# Altium integrated library mylib.IntLib: 236 symbols (part 1 of 2) (continued)
## NMOS
designator Q?
20V P-Channel Enhancement Mode MOSFET; DatasheetVersion: Jul-99; PackageReference: SOT23; PackageDescription: SOT-23; 3 Leads; Body 3.1 x 2.5 mm, inc. leads (LxW max), Alternate Lead Configuration; ComponentLink1Description: Manufacturer Link; ComponentLink1URL: http://www.zetex.com/; ComponentLink2Description: Datasheet; ComponentLink2URL: www.zetex.com/3.0/pdf/ZXM61P02F.pdf
footprint LC-SOT-23-3
pins: 1 G, 2 S, 3 D

## NMOS-1
designator Q?, comment NMOS
20V P-Channel Enhancement Mode MOSFET; DatasheetVersion: Jul-99; PackageReference: SOT23; PackageDescription: SOT-23; 3 Leads; Body 3.1 x 2.5 mm, inc. leads (LxW max), Alternate Lead Configuration; ComponentLink1Description: Manufacturer Link; ComponentLink1URL: http://www.zetex.com/; ComponentLink2Description: Datasheet; ComponentLink2URL: www.zetex.com/3.0/pdf/ZXM61P02F.pdf
footprint LC-SOT-23-3
pins: 1 G, 2 S, 3 D

## NPN
designator Q?, comment 8050
footprint SOT-23
pins: 1, 2, 3

## OPA453
designator U?
Wide-Bandwidth JFET Input Operational Amplifier
footprint TO-220_7
pins: 1 IN+ (in), 2 IN- (in), 3 NC, 4 V- (power), 5 V+ (power), 6 OUT (out), 7 Flag

## P87C54X2BDH
designator U?
footprint TSSOP-38
pins: 1 P30/RXD, 2 P31/TXD, 3 P33/~{INT}1, 4 P34/T0, 5 P36/~{WR}, 6 P37/~{RD}, 7 X2, 8 X1, 9 VSS, 10 P20/A8, 11 P21/A9, 12 P22/A10, 13 P23/A11, 14 P24/A12, 15 P25/A13, 16 P26/A14, 17 P27/A15, 18 ~{PSEN}, 19 ALE/~{PROG}, 20 ~{EA}/Vpp, 21 P07/AD7, 22 P06/AD6, 23 P05/AD5, 24 P04/AD4, 25 P03/AD3, 26 P02/AD2, 27 P01/AD1, 28 P00/AD0, 29 VDD, 30 P10/T2, 31 P11/T2EX, 32 P12, 33 P13, 34 P14, 35 P15, 36 P16, 37 P17, 38 RST

## P89LPC906
designator U?
footprint SO-8
pins: 1 RST/P1.5, 2 VSS, 3 P0.6/CMP1/KBI6, 4 XTAL1/P3.1, 5 CLKOUT/XTAL2/P3.0, 6 VDD, 7 P0.5/CMPREF/KBI5, 8 P0.4/CIN1A/KBI4

## P89LPC932
designator U?
footprint TSSOP-28
footprint PLCC-28
pins: 1 P20 (io), 2 P21 (io), 3 P00 (io), 4 P17 (io), 5 P16 (io), 6 P15/~{RST} (out), 7 VSS (io), 8 P31 (io), 9 P30 (io), 10 P14 (io), 11 P13 (io), 12 P12 (io), 13 P22 (io), 14 P23 (io), 15 P24 (io), 16 P25 (io), 17 P11 (io), 18 P10 (io), 19 P07 (io), 20 P06 (io), 21 VDD (power), 22 P05 (io), 23 P04 (io), 24 P03 (io), 25 P02 (io), 26 P01 (io), 27 P26 (io), 28 P27 (io)

## PCB_VIA
designator V?, comment via  (value not drawn)
footprint PCB_Via
pins: 1

## PCF8563
designator U?
footprint SO-8
pins: 1 Osci, 2 Osco, 3 /INT, 4 VSS, 5 SDA, 6 SCL, 7 Clko, 8 VDD

## PDIUSBD12
designator U?
footprint TSSOP-28
pins: 1 DATA0, 2 DATA1, 3 DATA2, 4 DATA3, 5 GND, 6 DATA4, 7 DATA5, 8 DATA6, 9 DATA7, 10 ALE, 11 CS_N, 12 SUSPEND, 13 CLKOUT, 14 INT_N, 15 RD_N, 16 WR_N, 17 DMREQ, 18 DMACK_N, 19 EOT_N, 20 RESET_N, 21 GL_N, 22 XTAL1, 23 XTAL2, 24 VCC, 25 D-, 26 D+, 27 VOUT3.3V, 28 A0

## PRTR5V0U2X
designator U?
footprint SOT-143B
pins: 1 GND, 2 I/O1, 3 I/O2, 4 VCC

## R5F100FE
designator U?
Supplier 1: Digi-Key; Supplier Part Number 1: R5F100FE
footprint QFP10X10-G44/P.8N
pins: 1 P4.1/TI07 (io), 2 P4.0/TOOL0 (io), 3 ~{RESET} (in), 4 P12.4/XT2 (in), 5 P12.3/XT1 (io), 6 P137/INTP0, 7 P12.2/X2 (io), 8 P12.1/X1 (io), 9 REGC (in), 10 Vss (power), 11 Vdd (io), 12 P6.0/SCL0 (io), 13 P6.1/SDA0 (io), 14 P6.2 (io), 15 P6.3 (io), 16 P3.1/TI03/PCLBUZ0 (io), 17 P7.3/KR3 (io), 18 P7.2/KR2 (io), 19 P7.1/KR1/SDA21 (io), 20 P7.0/KR0/SCL21 (io), 21 P3.0/SCL11/INTP3 (io), 22 P5.0/SDA11/INTP1 (io), 23 INTP2/P5.1 (io), 24 TI02/P1.7 (io), 25 TI01/P1.6 (io), 26 PCLBUZ1/P1.5 (out), 27 RXD2/P1.4 (out), 28 TXD2/P1.3 (io), 29 SO00/TXD0/P1.2 (out), 30 SI00/RXD0/P1.1 (io), 31 SCK00/SCL00/P1.0 (io), 32 P146 (power), 33 ANI18/P147 (power), 34 P2.7/AN17 (io), 35 P2.6/AN16 (io), 36 P2.5/AN15 (io), 37 P2.4/AN14 (io), 38 P2.3/AN13 (io), 39 P2.2 /AN12 (io), 40 P2.1/AN11 (io), 41 P2.0/AN10 (io), 42 P0.1/RxD1 (io), 43 P0.0/TxD1 (io), 44 P12.0/ANI19 (io)

## R5F100GE
designator U?  Supplier Part Number 1: R5F100FE
Supplier 1: Digi-Key
footprint QFP10X10-G44/P.8N
pins: 1 P4.1/TI07 (io), 2 P4.0/TOOL0 (io), 3 ~{RESET} (in), 4 P12.4/XT2 (in), 5 P12.3/XT1 (io), 6 P137/INTP0, 7 P12.2/X2 (io), 8 P12.1/X1 (io), 9 REGC (in), 10 Vss (power), 11 Vdd (io), 12 P6.0/SCL0 (io), 13 P6.1/SDA0 (io), 14 P6.2 (io), 15 P6.3 (io), 16 P3.1/TI03/PCLBUZ0 (io), 17 P7.3/KR3 (io), 18 P7.2/KR2 (io), 19 P7.1/KR1/SDA21 (io), 20 P7.0/KR0/SCL21 (io), 21 P3.0/SCL11/INTP3 (io), 22 P5.0/SDA11/INTP1 (io), 23 INTP2/P5.1 (io), 24 TI02/P1.7 (io), 25 TI01/P1.6 (io), 26 PCLBUZ1/P1.5 (out), 27 RXD2/P1.4 (out), 28 TXD2/P1.3 (io), 29 SO00/TXD0/P1.2 (out), 30 SI00/RXD0/P1.1 (io), 31 SCK00/SCL00/P1.0 (io), 32 P146 (power), 33 ANI18/P147 (power), 34 P2.7/AN17 (io), 35 P2.6/AN16 (io), 36 P2.5/AN15 (io), 37 P2.4/AN14 (io), 38 P2.3/AN13 (io), 39 P2.2 /AN12 (io), 40 P2.1/AN11 (io), 41 P2.0/AN10 (io), 42 P0.1/RxD1 (io), 43 P0.0/TxD1 (io), 44 P12.0/ANI19 (io)

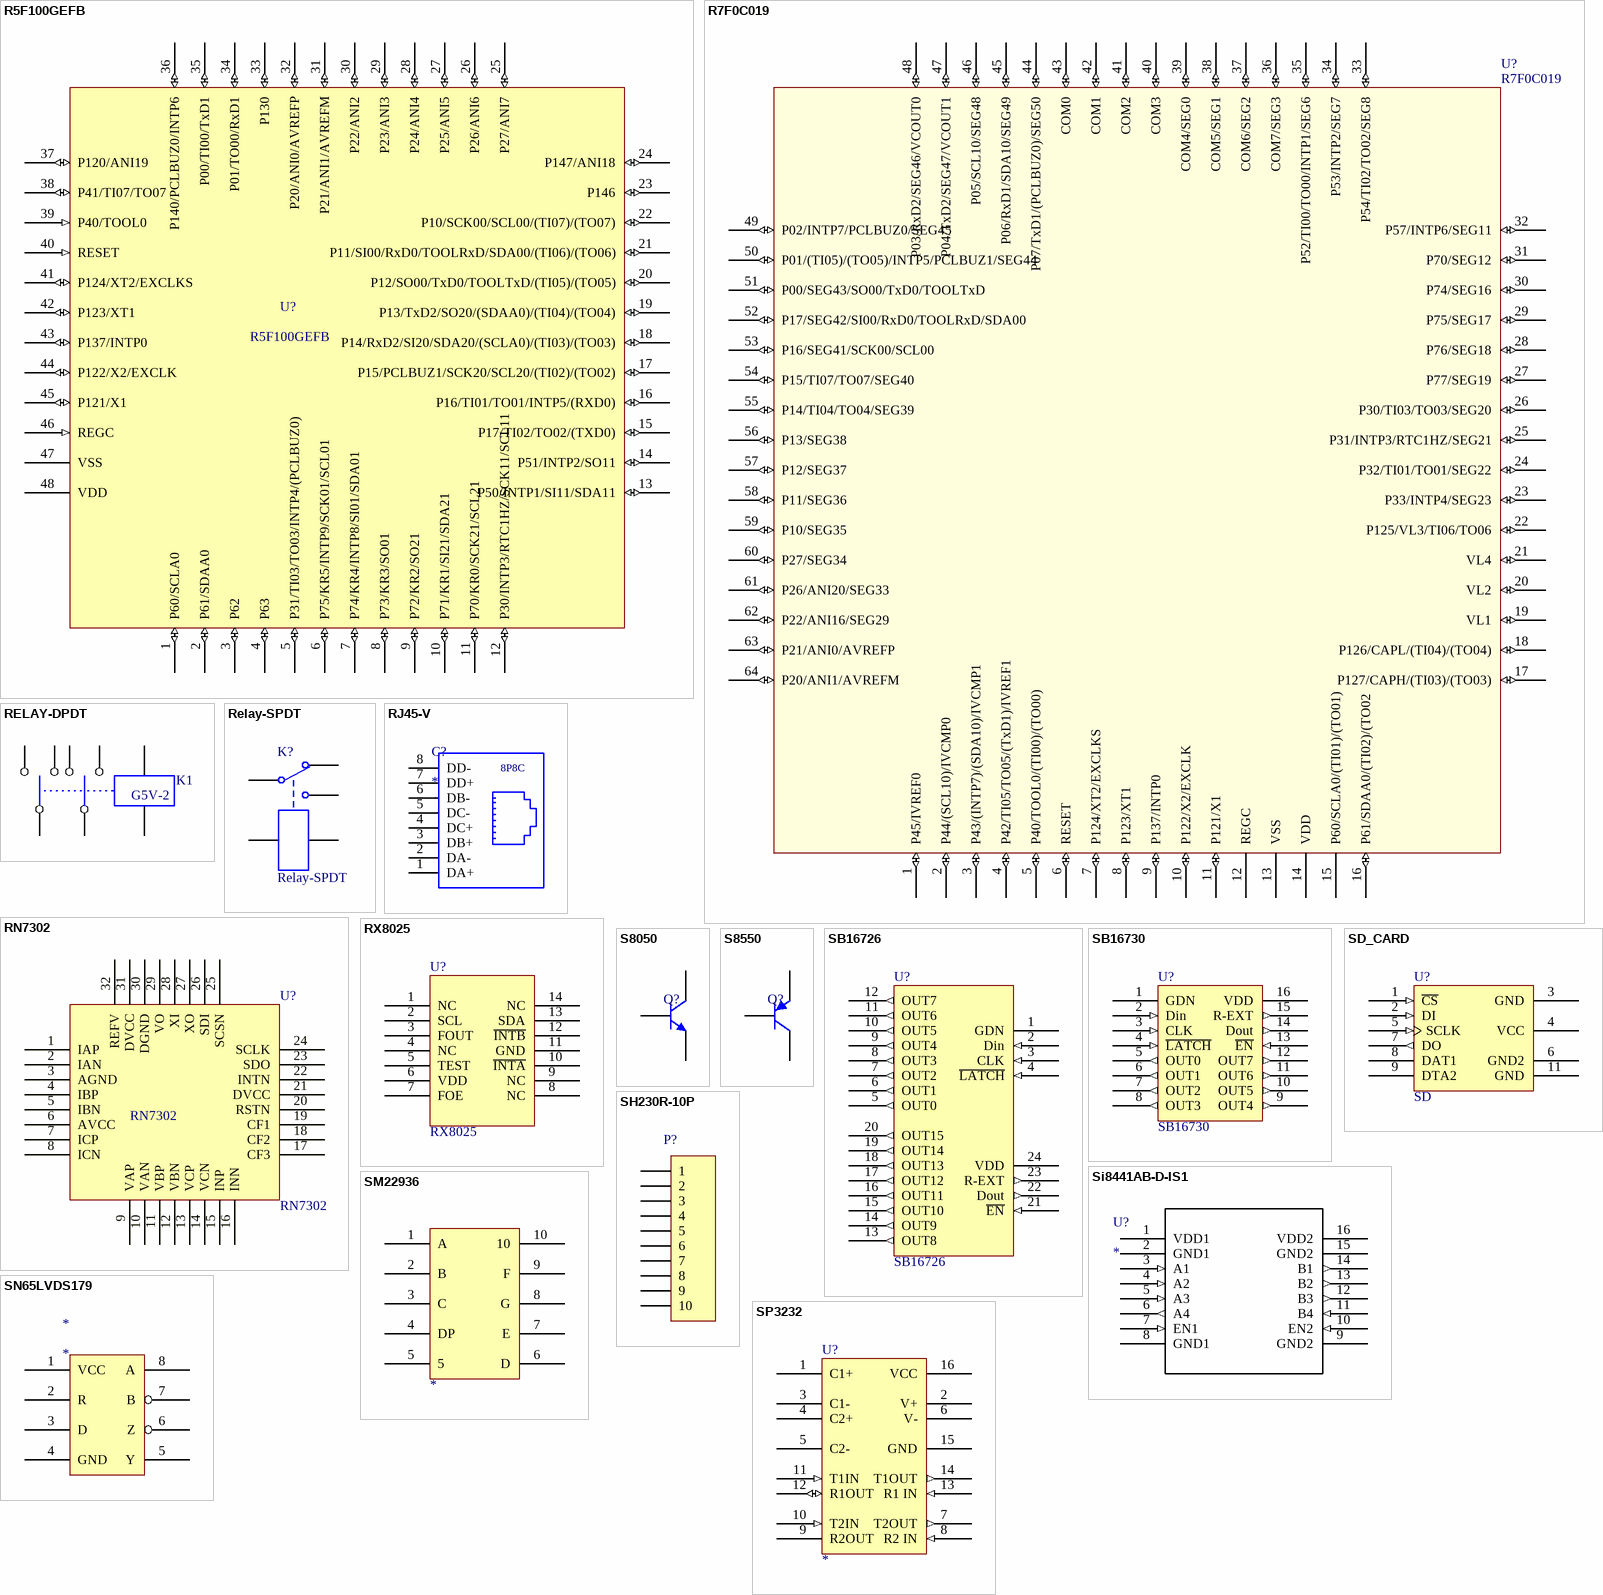
[diagram p6: symbols R5F100GEFB to SP3232]

## R5F100GEFB
designator U?
footprint LQFP48
pins: 1 P60/SCLA0 (io), 2 P61/SDAA0 (io), 3 P62 (io), 4 P63 (io), 5 P31/TI03/TO03/INTP4/(PCLBUZ0) (io), 6 P75/KR5/INTP9/SCK01/SCL01 (io), 7 P74/KR4/INTP8/SI01/SDA01 (io), 8 P73/KR3/SO01 (io), 9 P72/KR2/SO21 (io), 10 P71/KR1/SI21/SDA21 (io), 11 P70/KR0/SCK21/SCL21 (io), 12 P30/INTP3/RTC1HZ/SCK11/SCL11 (io), 13 P50/INTP1/SI11/SDA11 (io), 14 P51/INTP2/SO11 (io), 15 P17/TI02/TO02/(TXD0) (io), 16 P16/TI01/TO01/INTP5/(RXD0) (io), 17 P15/PCLBUZ1/SCK20/SCL20/(TI02)/(TO02) (io), 18 P14/RxD2/SI20/SDA20/(SCLA0)/(TI03)/(TO03) (io), 19 P13/TxD2/SO20/(SDAA0)/(TI04)/(TO04) (io), 20 P12/SO00/TxD0/TOOLTxD/(TI05)/(TO05) (io), 21 P11/SI00/RxD0/TOOLRxD/SDA00/(TI06)/(TO06) (io), 22 P10/SCK00/SCL00/(TI07)/(TO07) (io), 23 P146 (io), 24 P147/ANI18 (io), 25 P27/ANI7 (io), 26 P26/ANI6 (io), 27 P25/ANI5 (io), 28 P24/ANI4 (io), 29 P23/ANI3 (io), 30 P22/ANI2 (io), 31 P21/ANI1/AVREFM (io), 32 P20/ANI0/AVREFP (io), 33 P130 (io), 34 P01/TO00/RxD1 (io), 35 P00/TI00/TxD1 (io), 36 P140/PCLBUZ0/INTP6 (io), 37 P120/ANI19 (io), 38 P41/TI07/TO07 (io), 39 P40/TOOL0 (in), 40 RESET (in), 41 P124/XT2/EXCLKS (io), 42 P123/XT1 (io), 43 P137/INTP0 (io), 44 P122/X2/EXCLK (io), 45 P121/X1 (io), 46 REGC (in), 47 VSS (power), 48 VDD (power)

## R7F0C019
designator U?
footprint LC-LQFP-64_10x10x05P
pins: 1 P45/IVREF0 (io), 2 P44/(SCL10)/IVCMP0 (io), 3 P43/(INTP7)/(SDA10)/IVCMP1 (io), 4 P42/TI05/TO05/(TxD1)/IVREF1 (io), 5 P40/TOOL0/(TI00)/(TO00) (io), 6 RESET (io), 7 P124/XT2/EXCLKS (io), 8 P123/XT1 (io), 9 P137/INTP0 (io), 10 P122/X2/EXCLK (io), 11 P121/X1 (io), 12 REGC (power), 13 VSS (power), 14 VDD (power), 15 P60/SCLA0/(TI01)/(TO01) (power), 16 P61/SDAA0/(TI02)/(TO02 (io), 17 P127/CAPH/(TI03)/(TO03) (io), 18 P126/CAPL/(TI04)/(TO04) (io), 19 VL1 (io), 20 VL2 (io), 21 VL4 (io), 22 P125/VL3/TI06/TO06 (io), 23 P33/INTP4/SEG23 (io), 24 P32/TI01/TO01/SEG22 (io), 25 P31/INTP3/RTC1HZ/SEG21 (io), 26 P30/TI03/TO03/SEG20 (io), 27 P77/SEG19 (io), 28 P76/SEG18 (io), 29 P75/SEG17 (io), 30 P74/SEG16 (io), 31 P70/SEG12 (io), 32 P57/INTP6/SEG11 (io), 33 P54/TI02/TO02/SEG8 (io), 34 P53/INTP2/SEG7 (io), 35 P52/TI00/TO00/INTP1/SEG6 (io), 36 COM7/SEG3 (io), 37 COM6/SEG2 (io), 38 COM5/SEG1 (io), 39 COM4/SEG0 (io), 40 COM3 (io), 41 COM2 (io), 42 COM1 (io), 43 COM0 (io), 44 P07/TxD1/(PCLBUZ0)/SEG50 (io), 45 P06/RxD1/SDA10/SEG49 (io), 46 P05/SCL10/SEG48 (io), 47 P04/TxD2/SEG47/VCOUT1 (io), 48 P03/RxD2/SEG46/VCOUT0 (io), 49 P02/INTP7/PCLBUZ0/SEG45 (io), 50 P01/(TI05)/(TO05)/INTP5/PCLBUZ1/SEG44 (io), 51 P00/SEG43/SO00/TxD0/TOOLTxD (io), 52 P17/SEG42/SI00/RxD0/TOOLRxD/SDA00 (io), 53 P16/SEG41/SCK00/SCL00 (io), 54 P15/TI07/TO07/SEG40 (io), 55 P14/TI04/TO04/SEG39 (io), 56 P13/SEG38 (io), 57 P12/SEG37 (io), 58 P11/SEG36 (io), 59 P10/SEG35 (io), 60 P27/SEG34 (io), 61 P26/ANI20/SEG33 (io), 62 P22/ANI16/SEG29 (io), 63 P21/ANI0/AVREFP (io), 64 P20/ANI1/AVREFM (io)

## RELAY-DPDT
designator K1, comment G5V-2
footprint G5V-2
pins: 1, 2, 3, 4, 5, 6, 7, 8

## Relay-SPDT
designator K?
Single-Pole Dual-Throw Relay; Published: 24-Mar-1999; LatestRevisionDate: 17-Jul-2002; LatestRevisionNote: Re-released for DXP Platform.; PackageReference: MODULE5B; Publisher: Altium Limited
footprint JDQ_HF32FA
pins: 1, 2, 3, 4, 5

## RJ45-V
designator C?
WR-COM Modular Jack RJ45 Vertical; Manufacturer: Würth Elektronik eiSos GmbH; partNo: 615008138021; ComponentLink1 Description: Manufacturer; ComponentLink2 Description: Datasheet; NoPins: 8; ComponentLink1URL: http://www.we-online.de; ComponentLink2URL: http://katalog.we-online.de/em/datasheet/615008138021.pdf; Created by: Karrer Zheng; Created Date: 10/27/2014
footprint RJ45-V (RJ45 Vertical)
pins: 1 DA+, 2 DA-, 3 DB+, 4 DC+, 5 DC-, 6 DB-, 7 DD+, 8 DD-
text: 8P8C

## RN7302
designator U?
footprint LQFP32
footprint RN-LQFP32
pins: 1 IAP, 2 IAN, 3 AGND, 4 IBP, 5 IBN, 6 AVCC, 7 ICP, 8 ICN, 9 VAP, 10 VAN, 11 VBP, 12 VBN, 13 VCP, 14 VCN, 15 INP, 16 INN, 17 CF3, 18 CF2, 19 CF1, 20 RSTN, 21 DVCC, 22 INTN, 23 SDO, 24 SCLK, 25 SCSN, 26 SDI, 27 XO, 28 XI, 29 VO, 30 DGND, 31 DVCC, 32 REFV
2 alternate drawings of the same symbol

## RX8025
designator U?
U?
footprint RX8025 (Footprint not found)
pins: 1 NC, 2 SCL, 3 FOUT, 4 NC, 5 TEST, 6 VDD, 7 FOE, 8 NC, 9 NC, 10 ~{INTA}, 11 GND, 12 ~{INTB}, 13 SDA, 14 NC

## S8050
designator Q?  (value not drawn)
footprint LC-SOT-23-3
pins: 1, 2, 3

## S8550
designator Q?  (value not drawn)
footprint LC-SOT-23-3
pins: 1, 2, 3

## SB16726
designator U?
footprint SSOP24 (Footprint not found)
pins: 1 GDN (power), 2 Din (in), 3 CLK (in), 4 ~{LATCH} (in), 5 OUT0 (out), 6 OUT1 (out), 7 OUT2 (out), 8 OUT3 (out), 9 OUT4 (out), 10 OUT5 (out), 11 OUT6 (out), 12 OUT7 (out), 13 OUT8 (out), 14 OUT9 (out), 15 OUT10 (out), 16 OUT11 (out), 17 OUT12 (out), 18 OUT13 (out), 19 OUT14 (out), 20 OUT15 (out), 21 ~{EN} (in), 22 Dout (out), 23 R-EXT (out), 24 VDD (power)

## SB16730
designator U?
footprint Model Name (Footprint not found)
footprint SSOP20 (Footprint not found)
pins: 1 GDN (power), 2 Din (in), 3 CLK (in), 4 ~{LATCH} (in), 5 OUT0 (out), 6 OUT1 (out), 7 OUT2 (out), 8 OUT3 (out), 9 OUT4 (out), 10 OUT5 (out), 11 OUT6 (out), 12 OUT7 (out), 13 ~{EN} (in), 14 Dout (out), 15 R-EXT (out), 16 VDD (power)

## SD_CARD
designator U?, comment SD
footprint SD_CARD2
pins: 1 ~{CS} (in), 2 DI (in), 3 GND (power), 4 VCC (power), 5 SCLK (in), 6 GND2 (power), 7 DO (out), 8 DAT1, 9 DTA2, 11 GND (power)

## SH230R-10P
designator P?, comment SH230R-5.08  (value not drawn)
footprint SH230V-10P-5.08
pins: 1, 2, 3, 4, 5, 6, 7, 8, 9, 10

## Si8441AB-D-IS1
designator U?
Imported; RefDes: RefDes; Type: DEV; Value: Value
footprint SOIC-16
pins: 1 VDD1, 2 GND1, 3 A1 (in), 4 A2 (in), 5 A3 (in), 6 A4 (out), 7 EN1 (in), 8 GND1, 9 GND2, 10 EN2 (in), 11 B4 (in), 12 B3 (out), 13 B2 (out), 14 B1 (out), 15 GND2, 16 VDD2

## SM22936
designator ?
pins: 1 A, 2 B, 3 C, 4 DP, 5, 6 D, 7 E, 8 G, 9 F, 10

## SN65LVDS179
designator *
pins: 1 VCC (power), 2 R, 3 D, 4 GND (power), 5 Y, 6 Z, 7 B, 8 A

## SP3232
designator U?
+-15KV ESD-PROTECTED, +5V RS-232 TRANSCEIVERS
footprint SO-16
pins: 1 C1+, 2 V+ (power), 3 C1-, 4 C2+, 5 C2-, 6 V- (power), 7 T2OUT (out), 8 R2 IN (in), 9 R2OUT, 10 T2IN (in), 11 T1IN (in), 12 R1OUT (io), 13 R1 IN (in), 14 T1OUT (out), 15 GND (power), 16 VCC (power)

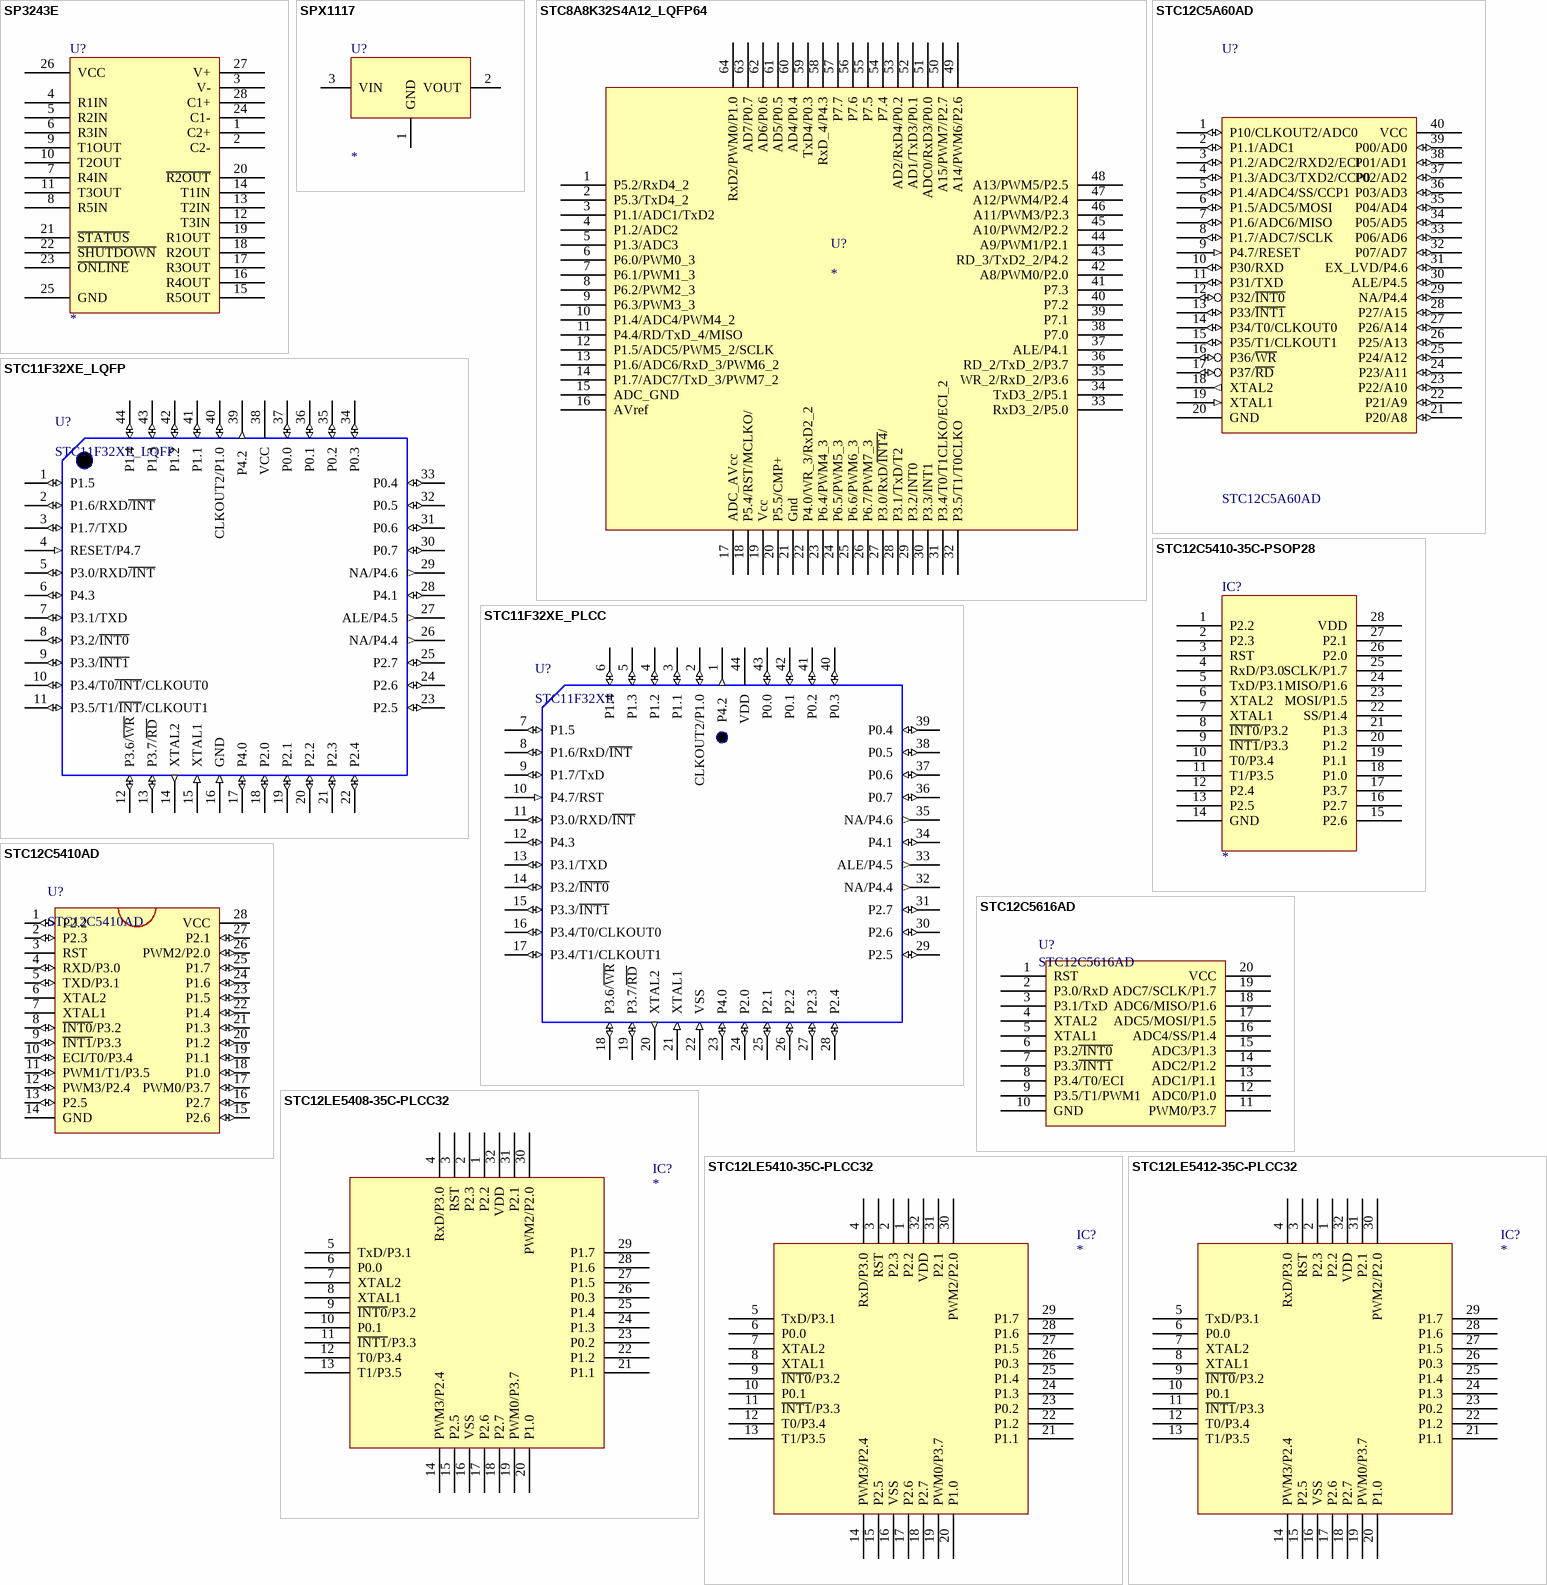
[diagram p7: symbols SP3243E to STC12LE5412-35C-PLCC32]

## SP3243E
designator U?
footprint SSOP-28
pins: 1 C2+, 2 C2-, 3 V-, 4 R1IN, 5 R2IN, 6 R3IN, 7 R4IN, 8 R5IN, 9 T1OUT, 10 T2OUT, 11 T3OUT, 12 T3IN, 13 T2IN, 14 T1IN, 15 R5OUT, 16 R4OUT, 17 R3OUT, 18 R2OUT, 19 R1OUT, 20 ~{R2OUT}, 21 ~{STATUS}, 22 ~{SHUTDOWN}, 23 ~{ONLINE}, 24 C1-, 25 GND, 26 VCC, 27 V+, 28 C1+

## SPX1117
designator U?
footprint SOT-223
pins: 1 GND, 2 VOUT, 3 VIN

## STC8A8K32S4A12_LQFP64
designator U?
footprint LQFP64S
pins: 1 P5.2/RxD4_2, 2 P5.3/TxD4_2, 3 P1.1/ADC1/TxD2, 4 P1.2/ADC2 , 5 P1.3/ADC3, 6 P6.0/PWM0_3, 7 P6.1/PWM1_3, 8 P6.2/PWM2_3, 9 P6.3/PWM3_3, 10 P1.4/ADC4/PWM4_2, 11 P4.4/RD/TxD_4/MISO, 12 P1.5/ADC5/PWM5_2/SCLK, 13 P1.6/ADC6/RxD_3/PWM6_2, 14 P1.7/ADC7/TxD_3/PWM7_2, 15 ADC_GND (power), 16 AVref (power), 17 ADC_AVcc, 18 P5.4/RST/MCLKO/ , 19 Vcc, 20 P5.5/CMP+, 21 Gnd, 22 P4.0/WR_3/RxD2_2, 23 P6.4/PWM4_3, 24 P6.5/PWM5_3, 25 P6.6/PWM6_3, 26 P6.7/PWM7_3, 27 P3.0/RxD/~{INT4}/ , 28 P3.1/TxD/T2, 29 P3.2/INT0, 30 P3.3/INT1, 31 P3.4/T0/T1CLKO/ECI_2, 32 P3.5/T1/T0CLKO, 33 RxD3_2/P5.0, 34 TxD3_2/P5.1, 35 WR_2/RxD_2/P3.6, 36 RD_2/TxD_2/P3.7, 37 ALE/P4.1, 38 P7.0, 39 P7.1, 40 P7.2, 41 P7.3, 42 A8/PWM0/P2.0, 43 RD_3/TxD2_2/P4.2, 44 A9/PWM1/P2.1, 45 A10/PWM2/P2.2, 46 A11/PWM3/P2.3, 47 A12/PWM4/P2.4, 48 A13/PWM5/P2.5, 49 A14/PWM6/P2.6, 50 A15/PWM7/P2.7, 51 ADC0/RxD3/P0.0, 52 AD1/TxD3/P0.1, 53 AD2/RxD4/P0.2, 54 P7.4, 55 P7.5, 56 P7.6, 57 P7.7, 58 RxD_4/P4.3, 59 TxD4/P0.3, 60 AD4/P0.4, 61 AD5/P0.5, 62 AD6/P0.6, 63 AD7/P0.7, 64 RxD2/PWM0/P1.0

## STC11F32XE_LQFP
designator U?
footprint QFP44
pins: 1 P1.5 (io), 2 P1.6/RXD~{/INT} (io), 3 P1.7/TXD (io), 4 RESET/P4.7 (in), 5 P3.0/RXD~{/INT} (io), 6 P4.3 (io), 7 P3.1/TXD (io), 8 P3.2/~{INT0} (io), 9 P3.3/~{INT1} (io), 10 P3.4/T0~{/INT}/CLKOUT0 (io), 11 P3.5/T1/~{INT}/CLKOUT1 (io), 12 P3.6/~{WR} (io), 13 P3.7/~{RD} (io), 14 XTAL2 (out), 15 XTAL1 (in), 16 GND (in), 17 P4.0 (io), 18 P2.0  (io), 19 P2.1  (io), 20 P2.2 (io), 21 P2.3  (io), 22 P2.4  (io), 23 P2.5 (io), 24 P2.6 (io), 25 P2.7 (io), 26 NA/P4.4 (out), 27 ALE/P4.5 (out), 28 P4.1 (io), 29 NA/P4.6 (out), 30 P0.7 (io), 31 P0.6 (io), 32 P0.5 (io), 33 P0.4 (io), 34 P0.3 (io), 35 P0.2 (io), 36 P0.1 (io), 37 P0.0 (io), 38 VCC (power), 39 P4.2  (out), 40 CLKOUT2/P1.0 (io), 41 P1.1 (io), 42 P1.2 (io), 43 P1.3 (io), 44 P1.4 (io)

## STC11F32XE_PLCC
designator U?, comment STC11F32XE
pins: 1 P4.2  (out), 2 CLKOUT2/P1.0 (io), 3 P1.1 (io), 4 P1.2 (io), 5 P1.3 (io), 6 P1.4 (io), 7 P1.5 (io), 8 P1.6/RxD/~{INT} (io), 9 P1.7/TxD (io), 10 P4.7/RST (in), 11 P3.0/RXD/~{INT} (io), 12 P4.3  (io), 13 P3.1/TXD (io), 14 P3.2/~{INT0} (io), 15 P3.3/~{INT1} (io), 16 P3.4/T0/CLKOUT0 (io), 17 P3.4/T1/CLKOUT1 (io), 18 P3.6/~{WR} (io), 19 P3.7/~{RD} (io), 20 XTAL2 (out), 21 XTAL1 (in), 22 VSS (in), 23 P4.0 (io), 24 P2.0  (io), 25 P2.1  (io), 26 P2.2  (io), 27 P2.3  (io), 28 P2.4  (io), 29 P2.5 (io), 30 P2.6 (io), 31 P2.7 (io), 32 NA/P4.4 (out), 33 ALE/P4.5 (out), 34 P4.1 (io), 35 NA/P4.6 (out), 36 P0.7 (io), 37 P0.6 (io), 38 P0.5 (io), 39 P0.4 (io), 40 P0.3 (io), 41 P0.2 (io), 42 P0.1 (io), 43 P0.0 (io), 44 VDD (power)

## STC12C5A60AD
designator U?
footprint DIP40
pins: 1 P10/CLKOUT2/ADC0 (io), 2 P1.1/ADC1 (io), 3 P1.2/ADC2/RXD2/ECI (io), 4 P1.3/ADC3/TXD2/CCP0 (io), 5 P1.4/ADC4/SS/CCP1 (io), 6 P1.5/ADC5/MOSI (io), 7 P1.6/ADC6/MISO (io), 8 P1.7/ADC7/SCLK (io), 9 P4.7/RESET (in), 10 P30/RXD (io), 11 P31/TXD (io), 12 P32/~{INT0} (io), 13 P33/~{INT1} (io), 14 P34/T0/CLKOUT0 (io), 15 P35/T1/CLKOUT1 (io), 16 P36/~{WR} (io), 17 P37/~{RD} (io), 18 XTAL2 (out), 19 XTAL1 (in), 20 GND (power), 21 P20/A8 (io), 22 P21/A9 (io), 23 P22/A10 (io), 24 P23/A11 (io), 25 P24/A12 (io), 26 P25/A13 (io), 27 P26/A14 (io), 28 P27/A15 (io), 29 NA/P4.4 (io), 30 ALE/P4.5 (io), 31 EX_LVD/P4.6 (io), 32 P07/AD7 (io), 33 P06/AD6 (io), 34 P05/AD5 (io), 35 P04/AD4 (io), 36 P03/AD3 (io), 37 P02/AD2 (io), 38 P01/AD1 (io), 39 P00/AD0 (io), 40 VCC (power)

## STC12C5410-35C-PSOP28
designator IC?
footprint SOP-28
footprint DIP-28
pins: 1 P2.2, 2 P2.3, 3 RST, 4 RxD/P3.0, 5 TxD/P3.1, 6 XTAL2, 7 XTAL1, 8 ~{INT0}/P3.2, 9 ~{INT1}/P3.3, 10 T0/P3.4, 11 T1/P3.5, 12 P2.4, 13 P2.5, 14 GND, 15 P2.6, 16 P2.7, 17 P3.7, 18 P1.0, 19 P1.1, 20 P1.2, 21 P1.3, 22 SS/P1.4, 23 MOSI/P1.5, 24 MISO/P1.6, 25 SCLK/P1.7, 26 P2.0, 27 P2.1, 28 VDD

## STC12C5410AD
designator U?
pins: 1 P2.2 (io), 2 P2.3 (io), 3 RST, 4 RXD/P3.0 (io), 5 TXD/P3.1 (io), 6 XTAL2, 7 XTAL1, 8 ~{INT0}/P3.2 (io), 9 ~{INT1}/P3.3 (io), 10 ECI/T0/P3.4 (io), 11 PWM1/T1/P3.5 (io), 12 PWM3/P2.4 (io), 13 P2.5 (io), 14 GND (power), 15 P2.6 (io), 16 P2.7 (io), 17 PWM0/P3.7 (io), 18 P1.0 (io), 19 P1.1 (io), 20 P1.2 (io), 21 P1.3 (io), 22 P1.4 (io), 23 P1.5 (io), 24 P1.6 (io), 25 P1.7 (io), 26 PWM2/P2.0 (io), 27 P2.1 (io), 28 VCC (power)

## STC12C5616AD
designator U?
footprint STC-SOP20
pins: 1 RST, 2 P3.0/RxD, 3 P3.1/TxD, 4 XTAL2, 5 XTAL1, 6 P3.2~{/INT0}, 7 P3.3~{/INT1}, 8 P3.4/T0/ECI, 9 P3.5/T1/PWM1, 10 GND, 11 PWM0/P3.7, 12 ADC0/P1.0, 13 ADC1/P1.1, 14 ADC2/P1.2, 15 ADC3/P1.3, 16 ADC4/SS/P1.4, 17 ADC5/MOSI/P1.5, 18 ADC6/MISO/P1.6, 19 ADC7/SCLK/P1.7, 20 VCC

## STC12LE5408-35C-PLCC32
designator IC?
footprint TQFP32
pins: 1 P2.2, 2 P2.3, 3 RST, 4 RxD/P3.0, 5 TxD/P3.1, 6 P0.0, 7 XTAL2, 8 XTAL1, 9 ~{INT0}/P3.2, 10 P0.1, 11 ~{INT1}/P3.3, 12 T0/P3.4, 13 T1/P3.5, 14 PWM3/P2.4, 15 P2.5, 16 VSS, 17 P2.6, 18 P2.7, 19 PWM0/P3.7, 20 P1.0, 21 P1.1, 22 P1.2, 23 P0.2, 24 P1.3, 25 P1.4, 26 P0.3, 27 P1.5, 28 P1.6, 29 P1.7, 30 PWM2/P2.0, 31 P2.1, 32 VDD

## STC12LE5410-35C-PLCC32
designator IC?
footprint TQFP32
pins: 1 P2.2, 2 P2.3, 3 RST, 4 RxD/P3.0, 5 TxD/P3.1, 6 P0.0, 7 XTAL2, 8 XTAL1, 9 ~{INT0}/P3.2, 10 P0.1, 11 ~{INT1}/P3.3, 12 T0/P3.4, 13 T1/P3.5, 14 PWM3/P2.4, 15 P2.5, 16 VSS, 17 P2.6, 18 P2.7, 19 PWM0/P3.7, 20 P1.0, 21 P1.1, 22 P1.2, 23 P0.2, 24 P1.3, 25 P1.4, 26 P0.3, 27 P1.5, 28 P1.6, 29 P1.7, 30 PWM2/P2.0, 31 P2.1, 32 VDD

## STC12LE5412-35C-PLCC32
designator IC?
footprint TQFP32
pins: 1 P2.2, 2 P2.3, 3 RST, 4 RxD/P3.0, 5 TxD/P3.1, 6 P0.0, 7 XTAL2, 8 XTAL1, 9 ~{INT0}/P3.2, 10 P0.1, 11 ~{INT1}/P3.3, 12 T0/P3.4, 13 T1/P3.5, 14 PWM3/P2.4, 15 P2.5, 16 VSS, 17 P2.6, 18 P2.7, 19 PWM0/P3.7, 20 P1.0, 21 P1.1, 22 P1.2, 23 P0.2, 24 P1.3, 25 P1.4, 26 P0.3, 27 P1.5, 28 P1.6, 29 P1.7, 30 PWM2/P2.0, 31 P2.1, 32 VDD

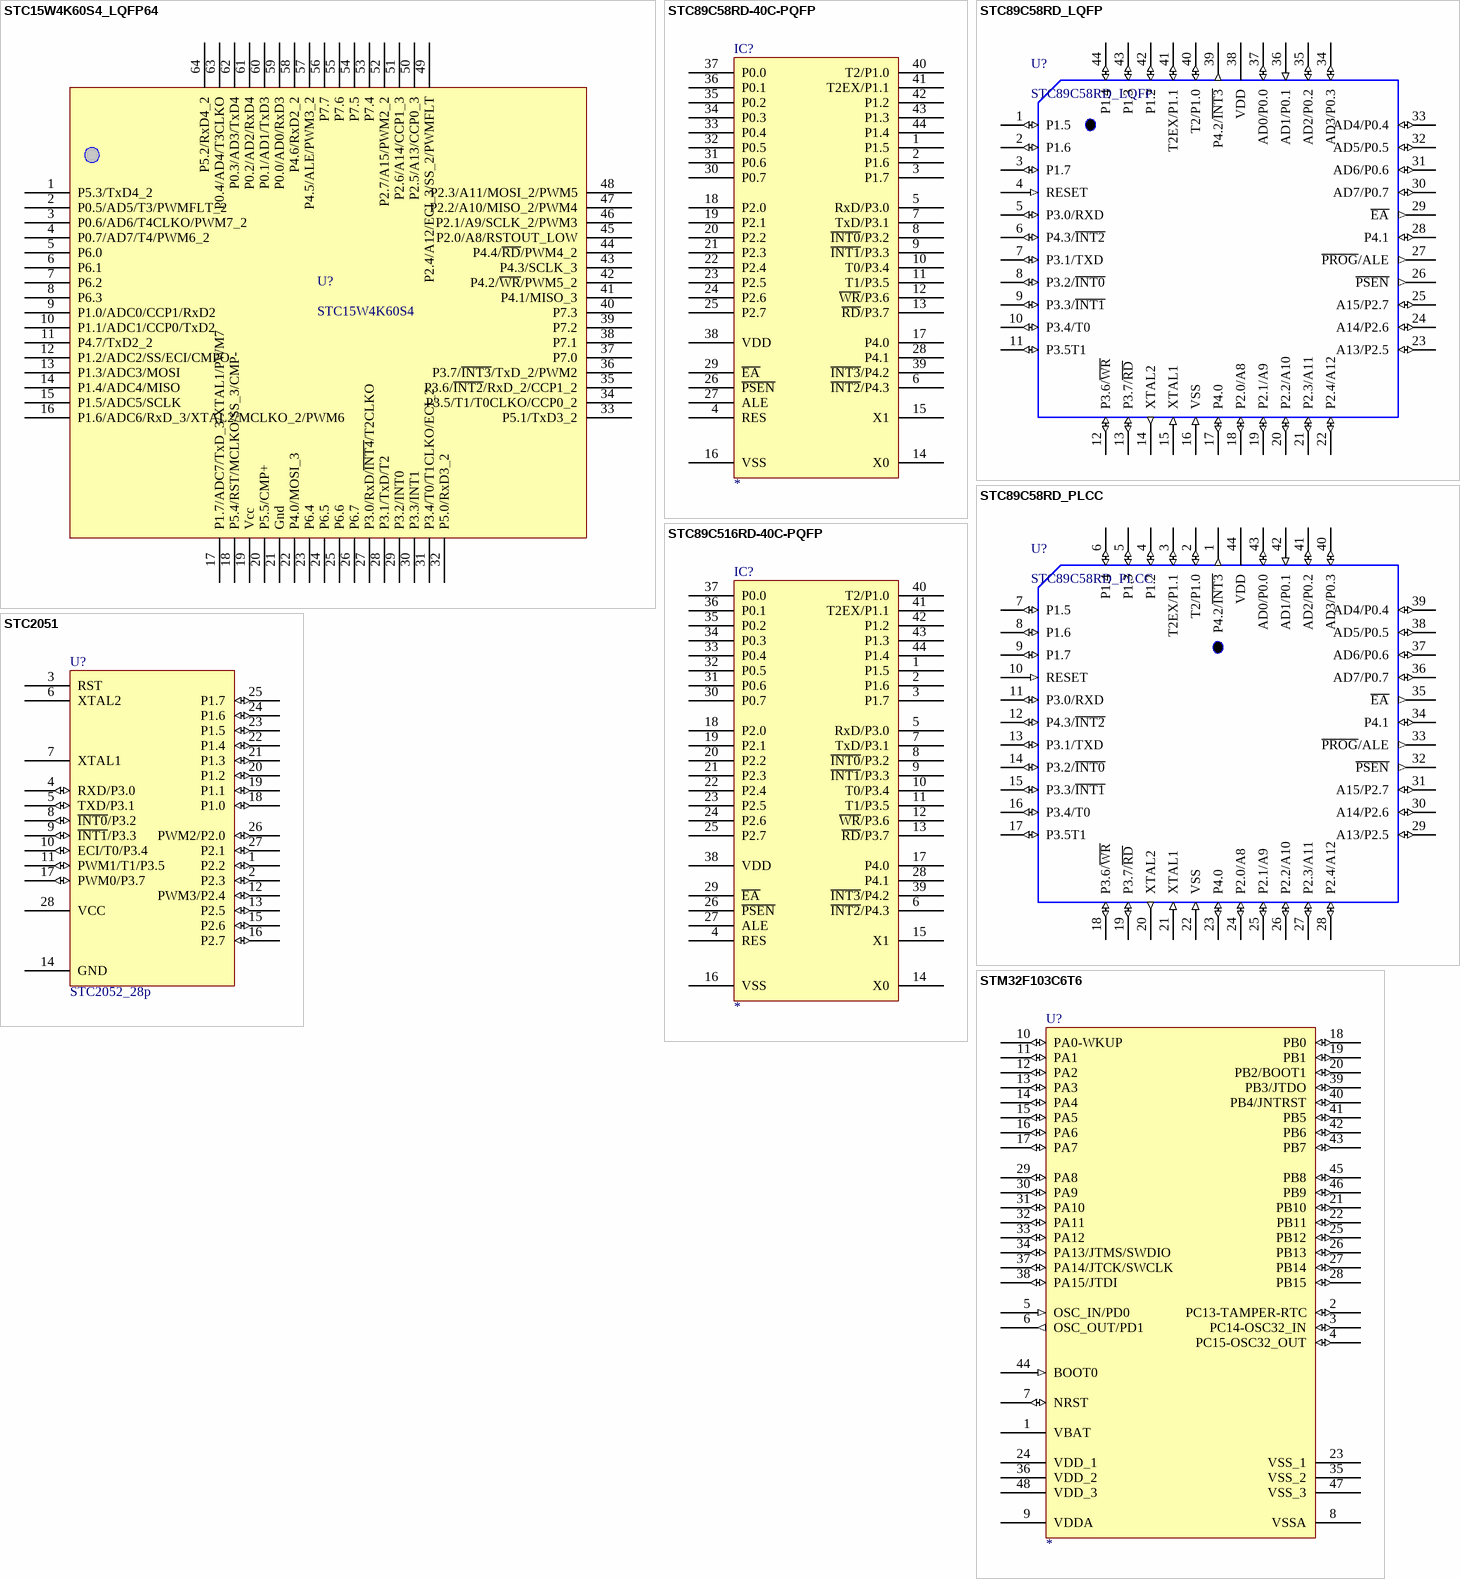
[diagram p8: symbols STC15W4K60S4_LQFP64 to STM32F103C6T6]